# Altium footprint library Разъемы.PcbLib: 291 footprints (part 9 of 19)
Each footprint in its own frame and in the unit in brackets; x right, y up, seen from the top. Pads: shape width x height; smd on the part's side, far side on the other; paste and mask are expansions set on the pad; w line width, h text height; cw(c..) or ccw(c..) is an arc to the next point about the centre after c.
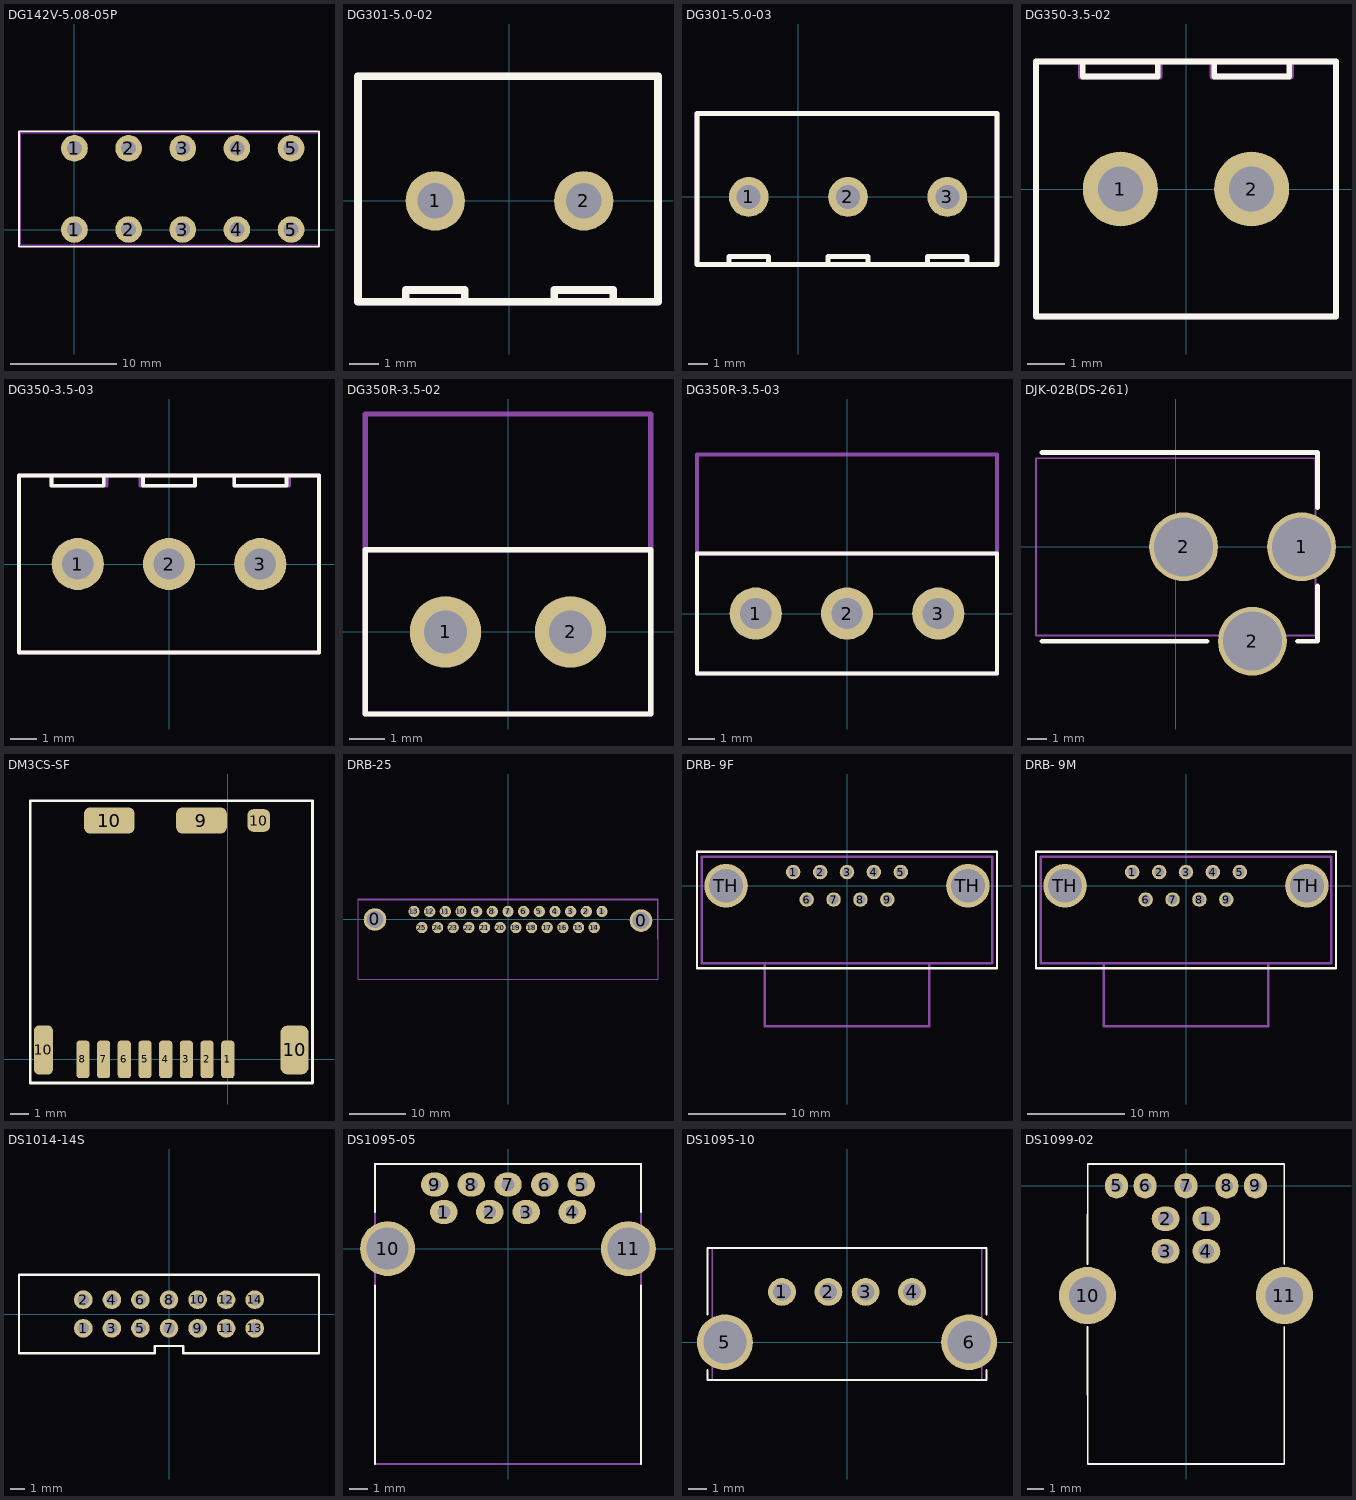
[diagram p8: the footprints below, top view; thin cyan lines are the x and y axes]

## DG142V-5.08-05P [mm]
height 15
pads (10):
  round 2.5 hole 1.4: 1(0,0) 1(0,7.62) 2(5.08,0) 2(5.08,7.62) 3(10.16,0) 3(10.16,7.62) 4(15.24,0) 4(15.24,7.62) 5(20.32,0) 5(20.32,7.62)
Top Overlay:
  lines w0.15: -5.2,-1.6 22.94,-1.6 22.94,9.2 -5.2,9.2 -5.2,-1.6
Top Courtyard:
  lines w0.15: -5.08,-1.5 -5.08,9.1 22.94,9.1 22.94,-1.5 -5.08,-1.5
Top Designator:
  text ".Designator" at 4.871,2.321 h0.8
3D body "DG142V-5.08-05P-14-00AH.STEP": height 14.1, standoff -3.5, extent -5.1,-4.1 22.84,9.1

## DG301-5.0-02 [mm] "DG301-5.0-02"
height 10
pads (2):
  round 2 hole 1.2: 1(-2.5,0) 2(2.5,0)
Top Overlay:
  lines w0.254: -3.5,-3.4 -3.5,-3 -1.5,-3 -1.5,-3.4 ; 1.5,-3.4 1.5,-3 3.5,-3 3.5,-3.4 ; -5.1,-3.4 5,-3.4 5,4.2 -5.1,4.2 -5.1,-3.4
Top Courtyard:
  lines w0.254: -5.1,-3.4 -5.1,4.2 5,4.2 5,-3.4 -5.1,-3.4
3D body "User Library-DG301-5_0-2P12.STEP": height 10, standoff -4.16, extent -5.6,-3.4 5,4.2

## DG301-5.0-03 [mm] "DG301-5.0-02"
height 10
pads (3):
  round 2 hole 1.2: 1(-2.5,0) 2(2.5,0) 3(7.5,0)
Top Overlay:
  lines w0.254: -3.5,-3.4 -3.5,-3 -1.5,-3 -1.5,-3.4 ; -0.1,-3.4 10,-3.4 10,4.2 -0.1,4.2 ; 5,-3.4 -5.1,-3.4 -5.1,4.2 5,4.2 ; 6.5,-3.4 6.5,-3 8.5,-3 8.5,-3.4 ; 1.5,-3 1.5,-3.4 1.5,-3 ; 1.5,-3 3.5,-3 ; 1.5,-3 3.5,-3 ; 3.5,-3 3.5,-3.4 3.5,-3
Top Courtyard:
  lines w0.254: -0.1,-3.4 10,-3.4 10,4.2 -0.1,4.2 ; 5,-3.4 -5.1,-3.4 -5.1,4.2 5,4.2
3D body "User Library-DG301-5_0-3P12.STEP": height 10, standoff -4.16, extent -5.6,-3.4 10,4.2

## DG350-3.5-02 [mm]
height 10
pads (2):
  round 2 hole 1.2: 1(-1.75,0) 2(1.75,0)
Top Overlay:
  lines w0.15: -2.75,3.4 -2.75,3 -0.75,3 -0.75,3.4 ; 0.75,3.4 0.75,3 2.75,3 2.75,3.4 ; -4,-3.4 -4,3.4 4,3.4 4,-3.4 -4,-3.4
Mechanical 29:
  lines w0.15: -2.8,3.4 -2.8,3 -0.7,3 -0.7,3.4 ; 0.7,3.4 0.7,3 2.8,3 2.8,3.4 ; -4,-3.4 4,-3.4 4,3.4 -4,3.4 -4,-3.4
3D body "DG350-3,5-02P.step": height 8.4, standoff -3.4, extent -4,-3.4 4,3.4

## DG350-3.5-03 [mm]
height 10
pads (3):
  round 2 hole 1.2: 1(-3.5,0) 2(0,0) 3(3.5,0)
Top Overlay:
  lines w0.15: -4.5,3.4 -4.5,3 -2.5,3 -2.5,3.4 ; -1,3.4 -1,3 1,3 1,3.4 ; 2.5,3.4 2.5,3 4.5,3 4.5,3.4 ; -5.75,-3.4 -5.75,3.4 5.75,3.4 5.75,-3.4 -5.75,-3.4
Mechanical 29:
  lines w0.15: -4.5,3.4 -4.5,3 -2.4,3 -2.4,3.4 ; -1.1,3.4 -1.1,3 1,3 1,3.4 ; 2.5,3.4 2.5,3 4.6,3 4.6,3.4 ; -5.75,-3.4 5.75,-3.4 5.75,3.4 -5.75,3.4 -5.75,-3.4
3D body "DG350-3,5-02P.step": height 8.4, standoff -3.4, extent -2.25,-3.4 5.75,3.4
3D body "DG350-3,5-02P.step": height 8.4, standoff -3.4, extent -5.75,-3.4 2.25,3.4

## DG350R-3.5-02 [mm]
height 7
pads (2):
  round 2 hole 1.2: 1(-1.75,0) 2(1.75,0)
Top Overlay:
  lines w0.15: -4,-2.3 -4,2.3 4,2.3 4,-2.3 -4,-2.3
Mechanical 29:
  lines w0.15: -4,2.3 4,2.3 ; -4,-2.3 -4,6.1 4,6.1 4,-2.3 -4,-2.3

## DG350R-3.5-03 [mm]
height 7
pads (3):
  round 2 hole 1.2: 1(-3.5,0) 2(0,0) 3(3.5,0)
Top Overlay:
  lines w0.15: -5.75,-2.3 5.75,-2.3 5.75,2.3 -5.75,2.3 -5.75,-2.3
Mechanical 29:
  lines w0.15: -5.75,2.3 5.75,2.3 ; -5.75,-2.3 5.75,-2.3 5.75,6.1 -5.75,6.1 -5.75,-2.3

## DJK-02B(DS-261) [mm]
height 11
pads (3):
  round 3.5 hole 3: 1(6.4,0) 2(0.4,0) 2(3.9,-4.8)
Top Overlay:
  lines w0.25: -6.8,-4.8 1.6,-4.8 ; -6.8,4.8 7.2,4.8 7.2,2 ; 6.2,-4.8 7.2,-4.8 7.2,-2
Mechanical 1:
  lines w0.1: -7.1,-4.5 -7.1,4.5 7.1,4.5 7.1,-4.5 -7.1,-4.5
3D body "DJK-02B(DS-261A).STEP": height 11, standoff -4.1, extent -7.1,-5.2 7.1,4.5

## DM3CS-SF [mm] "Hirose,  10 (8 + 2) Position Card Connector Secure Digital - microSDпїЅ Surface Mount, Right Angle Gold"
height 1.83
pads (13):
  rrect50% 0.7x2 smd: 1(0,0) 2(-1.1,0) 3(-2.2,0) 4(-3.3,0) 5(-4.4,0) 6(-5.5,0) 7(-6.6,0) 8(-7.7,0)
  rrect50% 2.7x1.4 smd: 9(-1.4,12.7) 10(-6.3,12.7)
  rrect50% 1x2.6 smd: 10(-9.8,0.5)
  rrect50% 1.2x1.2 smd: 10(1.65,12.7)
  rrect50% 1.5x2.6 smd: 10(3.55,0.5)
Top Overlay:
  lines w0.15: -10.5,-1.25 4.5,-1.25 4.5,13.75 -10.5,13.75 -10.5,-1.25
Top Designator:
  text ".Designator" at -6.999,5.983 h0.8
3D body "DM3CS-SF.stp": height 1.93, standoff 0, extent -9.9,-0.727 3.9,13.373

## DRB-25 [mm]
height 12.5
pads (27):
  round 4 hole 3: 0(-23.52,0) 0(23.52,-0.2)
  round 2 hole 1: 1(16.62,1.42) 2(13.85,1.42) 3(11.08,1.42) 4(8.31,1.42) 5(5.54,1.42) 6(2.77,1.42) 7(0,1.42) 8(-2.77,1.42) 9(-5.54,1.42) 10(-8.31,1.42) 11(-11.08,1.42) 12(-13.85,1.42) 13(-16.62,1.42) 14(15.24,-1.42) 15(12.47,-1.42) 16(9.7,-1.42) 17(6.93,-1.42) 18(4.16,-1.42) 19(1.39,-1.42) 20(-1.38,-1.42) 21(-4.15,-1.42) 22(-6.92,-1.42) 23(-9.69,-1.42) 24(-12.46,-1.42) 25(-15.23,-1.42)
Top Designator:
  text ".Designator" at -3.999,-6.944 h0.8
Mechanical 29:
  lines w0.15: -26.5,-3.5 -26.5,3.5 26.5,3.5 26.5,-3.5 ; -26.52,-10.6 -26.52,3.7 26.52,3.7 26.52,-10.6 -26.52,-10.6
  text ".Designator" at -3.5,-3.8 h1
3D body "DB-25S-1A5N-A191-A197.STEP": height 13.77, standoff -3.48, extent -26.55,-17.13 26.55,3.4

## DRB- 9F [mm]
height 12.5
pads (11):
  round 1.5 hole 1: 1(-5.56,1.42) 2(-2.78,1.42) 3(0,1.42) 4(2.78,1.42) 5(5.56,1.42) 6(-4.17,-1.42) 7(-1.39,-1.42) 8(1.39,-1.42) 9(4.17,-1.42)
  round 4.5 hole 3.5: TH(-12.5,0) TH(12.5,0)
Top Overlay:
  lines w0.254: -15.5,-8.5 -15.5,3.5 15.5,3.5 15.5,-8.5 -15.5,-8.5
Top Designator:
  text ".Designator" at -3.999,-5.767 h0.8
Mechanical 29:
  lines w0.254: -8.5,-8 -8.5,-14.5 8.5,-14.5 8.5,-8 ; -15,-8 -15,3 15,3 15,-8 -15,-8
  text ".Designator" at -6,-6 h1.52
3D body "DB-9F.step": height 12.75, standoff -3.65, extent -15.25,-13.5 15.25,3.2

## DRB- 9M [mm]
height 12.5
pads (11):
  round 1.5 hole 1: 1(-5.56,1.42) 2(-2.78,1.42) 3(0,1.42) 4(2.78,1.42) 5(5.56,1.42) 6(-4.17,-1.42) 7(-1.39,-1.42) 8(1.39,-1.42) 9(4.17,-1.42)
  round 4.5 hole 3.5: TH(-12.5,0) TH(12.5,0)
Top Overlay:
  lines w0.254: -15.5,-8.5 -15.5,3.5 15.5,3.5 15.5,-8.5 -15.5,-8.5
Top Designator:
  text ".Designator" at -3.999,-6.653 h0.8
Mechanical 29:
  lines w0.254: -8.5,-8 -8.5,-14.5 8.5,-14.5 8.5,-8 ; -15,-8 -15,3 15,3 15,-8 -15,-8
  text ".Designator" at -6,-6 h1.52
3D body "DRB-9MB.STEP": height 12.6, standoff -3.2, extent -15.4,-16.4 15.4,3.4

## DS1014-14S [mm]
pads (14):
  round 1.3 hole 0.8: 1(-6,-1) 2(-6,1) 3(-4,-1) 4(-4,1) 5(-2,-1) 6(-2,1) 7(0,-1) 8(0,1) 9(2,-1) 10(2,1) 11(4,-1) 12(4,1) 13(6,-1) 14(6,1)
Top Overlay:
  lines w0.15: -10.5,-2.75 -10.5,2.75 10.5,2.75 10.5,-2.75 1,-2.75 1,-2.25 -1,-2.25 -1,-2.75 -10.5,-2.75
  text "." at -6.179,-3.28 h0.1
3D body "BH2-14.step": height 5.65, standoff -3.6, extent -10.5,-2.75 10.5,2.7

## DS1095-05 [mm]
height 7.1
pads (11):
  oval 1.5x1.3 hole 0.7: 1(-3.5,2) 2(-1,2) 3(1,2) 4(3.5,2) 5(4,3.5) 6(2,3.5) 7(0,3.5) 8(-2,3.5) 9(-4,3.5)
  round 3 hole 2.3: 10(-6.57,0) 11(6.57,0)
Top Overlay:
  lines w0.1: -7.25,-11.75 -7.25,-2 ; -7.25,2 -7.25,4.62 7.25,4.62 7.25,2 ; 7.25,-11.75 7.25,-2
Mechanical 1:
  lines w0.1: -7.25,-11.75 -7.25,4.62 7.25,4.62 7.25,-11.75 -7.25,-11.75

## DS1095-10 [mm]
height 15
pads (6):
  round 1.5 hole 0.95: 1(-3.5,2.71) 2(-1,2.71) 3(1,2.71) 4(3.5,2.71)
  round 3 hole 2.3: 5(-6.57,0) 6(6.57,0)
Top Overlay:
  lines w0.1: -7.5,-1.5 -7.5,-2.04 -7.25,-2.04 7.25,-2.04 7.5,-2.04 7.5,-1.5 ; -7.5,1.5 -7.5,5.08 -7.25,5.08 7.25,5.08 7.5,5.08 7.5,1.5
Mechanical 1:
  lines w0.1: -7.25,-2.04 7.25,-2.04 7.25,5.08 -7.25,5.08 -7.25,-2.04

## DS1099-02 [mm]
height 10.8
pads (11):
  oval 1.7x1.5 hole 0.95: 1(1.25,-2) 2(-1.25,-2) 3(-1.25,-4) 4(1.25,-4)
  oval 1.4x1.55 hole 0.75: 5(-4.25,0) 6(-2.5,0) 7(0,0) 8(2.5,0) 9(4.25,0)
  round 3.5 hole 2.3: 10(-6.02,-6.71) 11(6.02,-6.71)
Top Overlay:
  lines w0.1: -6.025,-8.625 -6.02,-17.01 6.02,-17.01 6.015,-8.625 ; -6.025,-4.775 -6.02,1.34 6.02,1.34 6.015,-4.775
3D body "USB3-B.STEP": height 12.87, standoff -3.05, extent -6.01,-16.98 5.99,1.37